# Altium schematic symbol library TI Power Management Shunt Voltage Reference.SchLib: 1526 symbols (part 1 of 18) (continued)
## LM385BDRG4-2-5
designator U?
Micropower Voltage Reference, 2.5 V, 20 ppm / degC, 20 mA, 0 to 70 degC, 8-pin SOIC (D), Green (RoHS & no Sb/Br); Manufacturer: Texas Instruments; PartNumber: LM385BDRG4-2-5; Initial Accuracy @ 25/deg C(%): 1.5; Iout/Iz(Max)(mA): 20; Rating: Catalog; SubFamily: Shunt Voltage Reference; VO(V): 2.5; DatasheetVersion: SLVS023J; PackageVersion: 4040047-3/M; PackageReference: D8; PackageDescription: 8-Pin Plastic Small Outline, Body 4.9 x 3.9 mm, Pitch 1.27 mm; Supplier 1: Digi-Key; Supplier Part Number 1: LM385BDRG4-2-5-ND; Supplier 2: Newark; Supplier Part Number 2: 41M3423; Supplier 3: Mouser; Supplier Part Number 3: 595-LM385BDRG4-2-5; Eco-Plan: Green (RoHS & no Sb/Br); Min Iz for Regulation(uA): 20; Temp Coeff(Typ)(ppm/ degree C): 20; Mounting Technology: Surface Mount; Code_JEDEC: MS-012; ComponentLink1Description: Manufacturer URL; ComponentLink1URL: http://www.ti.com/; ComponentLink2Description: Datasheet; ComponentLink2URL: http://www.ti.com/general/docs/lit/getliterature.tsp?genericPartNumber=LM385B-2.5&fileType=pdf; ComponentLink3Description: Package Specification; ComponentLink3URL: http://www.ti.com/litv/pdf/msoi002j
footprint TI-D8_N (SOIC, 8-Leads, Body 4.9x3.9mm, Pitch 1.27mm, IPC Medium Density)
part A pins: 4 ANODE, 8 CATHODE
part B pins: 1 NC "No internal connection", 2 NC "No internal connection", 3 NC "No internal connection", 5 NC "No internal connection", 6 NC "No internal connection", 7 NC "No internal connection"

## LM385BLP-1-2
designator U?
Micropower Voltage Reference, 20 ppm / degC, 20 mA, 0 to 70 degC, 3-pin TO-92 (LP), Pb-Free (RoHS); Manufacturer: Texas Instruments; PartNumber: LM385BLP-1-2; Initial Accuracy @ 25/deg C(%): 1; Iout/Iz(Max)(mA): 20; Min Iz for Regulation(uA): 10; Rating: Catalog; SubFamily: Shunt Voltage Reference; VO(V): 1.235; DatasheetVersion: SLVS075I; PackageVersion: 4040001-2/C; PackageReference: LP3; PackageDescription: Plastic Cylindrical Package, Formed Lead Option (TO-92); Supplier 1: Digi-Key; Supplier Part Number 1: 296-9558-5-ND; Supplier 2: Farnell; Supplier Part Number 2: 1690615; Supplier 3: Newark; Supplier Part Number 3: 14P6051; Supplier 4: Mouser; Supplier Part Number 4: 595-LM385BLP-1-2; Eco-Plan: Pb-Free (RoHS); Temp Coeff(Typ)(ppm/ degree C): 20; Mounting Technology: Through Hole; Code_JEDEC: TO-226; ComponentLink1Description: Manufacturer URL; ComponentLink1URL: http://www.ti.com/; ComponentLink2Description: Datasheet; ComponentLink2URL: http://www.ti.com/general/docs/lit/getliterature.tsp?genericPartNumber=LM385B-1.2&fileType=pdf; ComponentLink3Description: Package Specification; ComponentLink3URL: http://www.ti.com/litv/pdf/msot002a
footprint TI-LP3 (TO, Flat Index; 3 In-Line, Formed Axial Leads; Body Dia. 4.8mm; Leads 0.56 x 0.41 mm (max))
pins: 1 NC, 2 CATHODE, 3 ANODE

## LM385BLP-2-5
designator U?
Micropower Voltage Reference, 2.5 V, 20 ppm / degC, 20 mA, 0 to 70 degC, 3-pin TO-92 (LP), Pb-Free (RoHS); Manufacturer: Texas Instruments; PartNumber: LM385BLP-2-5; Initial Accuracy @ 25/deg C(%): 1.5; Iout/Iz(Max)(mA): 20; Rating: Catalog; SubFamily: Shunt Voltage Reference; VO(V): 2.5; DatasheetVersion: SLVS023J; PackageVersion: 4040001-2/C; PackageReference: LP3; PackageDescription: Plastic Cylindrical Package, Formed Lead Option (TO-92); Supplier 1: Digi-Key; Supplier Part Number 1: 296-9559-5-ND; Supplier 2: Newark; Supplier Part Number 2: 06F9436; Supplier 3: Mouser; Supplier Part Number 3: 595-LM385BLP-2-5; Eco-Plan: Pb-Free (RoHS); Min Iz for Regulation(uA): 20; Temp Coeff(Typ)(ppm/ degree C): 20; Mounting Technology: Through Hole; Code_JEDEC: TO-226; ComponentLink1Description: Manufacturer URL; ComponentLink1URL: http://www.ti.com/; ComponentLink2Description: Datasheet; ComponentLink2URL: http://www.ti.com/general/docs/lit/getliterature.tsp?genericPartNumber=LM385B-2.5&fileType=pdf; ComponentLink3Description: Package Specification; ComponentLink3URL: http://www.ti.com/litv/pdf/msot002a
footprint TI-LP3 (TO, Flat Index; 3 In-Line, Formed Axial Leads; Body Dia. 4.8mm; Leads 0.56 x 0.41 mm (max))
pins: 1 NC, 2 CATHODE, 3 ANODE

## LM385BLPE3-1-2
designator U?
Micropower Voltage Reference, 20 ppm / degC, 20 mA, 0 to 70 degC, 3-pin TO-92 (LP), Pb-Free (RoHS); Manufacturer: Texas Instruments; PartNumber: LM385BLPE3-1-2; Initial Accuracy @ 25/deg C(%): 2; Iout/Iz(Max)(mA): 20; Min Iz for Regulation(uA): 10; Rating: Catalog; SubFamily: Shunt Voltage Reference; VO(V): 1.235; DatasheetVersion: SLVS075I; PackageVersion: 4040001-2/C; PackageReference: LP3; PackageDescription: Plastic Cylindrical Package, Formed Lead Option (TO-92); Supplier 1: Digi-Key; Supplier Part Number 1: LM385BLPE3-1-2-ND; Supplier 2: Mouser; Supplier Part Number 2: 595-LM385BLPE3-1-2; Eco-Plan: Pb-Free (RoHS); Temp Coeff(Typ)(ppm/ degree C): 20; Mounting Technology: Through Hole; Code_JEDEC: TO-226; ComponentLink1Description: Manufacturer URL; ComponentLink1URL: http://www.ti.com/; ComponentLink2Description: Datasheet; ComponentLink2URL: http://www.ti.com/general/docs/lit/getliterature.tsp?genericPartNumber=LM385-1.2&fileType=pdf; ComponentLink3Description: Package Specification; ComponentLink3URL: http://www.ti.com/litv/pdf/msot002a
footprint TI-LP3 (TO, Flat Index; 3 In-Line, Formed Axial Leads; Body Dia. 4.8mm; Leads 0.56 x 0.41 mm (max))
pins: 1 NC, 2 CATHODE, 3 ANODE

## LM385BLPE3-2-5
designator U?
Micropower Voltage Reference, 2.5 V, 20 ppm / degC, 20 mA, 0 to 70 degC, 3-pin TO-92 (LP), Pb-Free (RoHS); Manufacturer: Texas Instruments; PartNumber: LM385BLPE3-2-5; Initial Accuracy @ 25/deg C(%): 3; Iout/Iz(Max)(mA): 20; Rating: Catalog; SubFamily: Shunt Voltage Reference; VO(V): 2.5; DatasheetVersion: SLVS023J; PackageVersion: 4040001-2/C; PackageReference: LP3; PackageDescription: Plastic Cylindrical Package, Formed Lead Option (TO-92); Supplier 1: Digi-Key; Supplier Part Number 1: LM385BLPE3-2-5-ND; Supplier 2: Newark; Supplier Part Number 2: 67K8075; Supplier 3: Mouser; Supplier Part Number 3: 595-LM385BLPE3-2-5; Eco-Plan: Pb-Free (RoHS); Min Iz for Regulation(uA): 20; Temp Coeff(Typ)(ppm/ degree C): 20; Mounting Technology: Through Hole; Code_JEDEC: TO-226; ComponentLink1Description: Manufacturer URL; ComponentLink1URL: http://www.ti.com/; ComponentLink2Description: Datasheet; ComponentLink2URL: http://www.ti.com/general/docs/lit/getliterature.tsp?genericPartNumber=LM385-2.5&fileType=pdf; ComponentLink3Description: Package Specification; ComponentLink3URL: http://www.ti.com/litv/pdf/msot002a
footprint TI-LP3 (TO, Flat Index; 3 In-Line, Formed Axial Leads; Body Dia. 4.8mm; Leads 0.56 x 0.41 mm (max))
pins: 1 NC, 2 CATHODE, 3 ANODE

## LM385BLPR-1-2
designator U?
Micropower Voltage Reference, 20 ppm / degC, 20 mA, 0 to 70 degC, 3-pin TO-92 (LP), Pb-Free (RoHS); Manufacturer: Texas Instruments; PartNumber: LM385BLPR-1-2; Initial Accuracy @ 25/deg C(%): 1; Iout/Iz(Max)(mA): 20; Min Iz for Regulation(uA): 10; Rating: Catalog; SubFamily: Shunt Voltage Reference; VO(V): 1.235; DatasheetVersion: SLVS075I; PackageVersion: 4040001-2/C; PackageReference: LP3; PackageDescription: Plastic Cylindrical Package, Formed Lead Option (TO-92); Supplier 1: Digi-Key; Supplier Part Number 1: 296-31450-2-ND; Supplier 2: Digi-Key; Supplier Part Number 2: 296-31450-1-ND; Supplier 3: Newark; Supplier Part Number 3: 75C0850; Supplier 4: Mouser; Supplier Part Number 4: 595-LM385BLPR-1-2; Eco-Plan: Pb-Free (RoHS); Temp Coeff(Typ)(ppm/ degree C): 20; Mounting Technology: Through Hole; Code_JEDEC: TO-226; ComponentLink1Description: Manufacturer URL; ComponentLink1URL: http://www.ti.com/; ComponentLink2Description: Datasheet; ComponentLink2URL: http://www.ti.com/general/docs/lit/getliterature.tsp?genericPartNumber=LM385B-1.2&fileType=pdf; ComponentLink3Description: Package Specification; ComponentLink3URL: http://www.ti.com/litv/pdf/msot002a
footprint TI-LP3 (TO, Flat Index; 3 In-Line, Formed Axial Leads; Body Dia. 4.8mm; Leads 0.56 x 0.41 mm (max))
pins: 1 NC, 2 CATHODE, 3 ANODE

## LM385BLPR-2-5
designator U?
Micropower Voltage Reference, 2.5 V, 20 ppm / degC, 20 mA, 0 to 70 degC, 3-pin TO-92 (LP), Pb-Free (RoHS); Manufacturer: Texas Instruments; PartNumber: LM385BLPR-2-5; Initial Accuracy @ 25/deg C(%): 1.5; Iout/Iz(Max)(mA): 20; Rating: Catalog; SubFamily: Shunt Voltage Reference; VO(V): 2.5; DatasheetVersion: SLVS023J; PackageVersion: 4040001-2/C; PackageReference: LP3; PackageDescription: Plastic Cylindrical Package, Formed Lead Option (TO-92); Supplier 1: Digi-Key; Supplier Part Number 1: LM385BLPR-2-5-ND; Supplier 2: Mouser; Supplier Part Number 2: 595-LM385BLPR-2-5; Eco-Plan: Pb-Free (RoHS); Min Iz for Regulation(uA): 20; Temp Coeff(Typ)(ppm/ degree C): 20; Mounting Technology: Through Hole; Code_JEDEC: TO-226; ComponentLink1Description: Manufacturer URL; ComponentLink1URL: http://www.ti.com/; ComponentLink2Description: Datasheet; ComponentLink2URL: http://www.ti.com/general/docs/lit/getliterature.tsp?genericPartNumber=LM385B-2.5&fileType=pdf; ComponentLink3Description: Package Specification; ComponentLink3URL: http://www.ti.com/litv/pdf/msot002a
footprint TI-LP3 (TO, Flat Index; 3 In-Line, Formed Axial Leads; Body Dia. 4.8mm; Leads 0.56 x 0.41 mm (max))
pins: 1 NC, 2 CATHODE, 3 ANODE

## LM385BLPRE3-1-2
designator U?
Micropower Voltage Reference, 20 ppm / degC, 20 mA, 0 to 70 degC, 3-pin TO-92 (LP), Pb-Free (RoHS); Manufacturer: Texas Instruments; PartNumber: LM385BLPRE3-1-2; Initial Accuracy @ 25/deg C(%): 2; Iout/Iz(Max)(mA): 20; Min Iz for Regulation(uA): 10; Rating: Catalog; SubFamily: Shunt Voltage Reference; VO(V): 1.235; DatasheetVersion: SLVS075I; PackageVersion: 4040001-2/C; PackageReference: LP3; PackageDescription: Plastic Cylindrical Package, Formed Lead Option (TO-92); Supplier 1: Digi-Key; Supplier Part Number 1: LM385BLPRE3-1-2-ND; Supplier 2: Mouser; Supplier Part Number 2: 595-LM385BLPRE3-1-2; Eco-Plan: Pb-Free (RoHS); Temp Coeff(Typ)(ppm/ degree C): 20; Mounting Technology: Through Hole; Code_JEDEC: TO-226; ComponentLink1Description: Manufacturer URL; ComponentLink1URL: http://www.ti.com/; ComponentLink2Description: Datasheet; ComponentLink2URL: http://www.ti.com/general/docs/lit/getliterature.tsp?genericPartNumber=LM385-1.2&fileType=pdf; ComponentLink3Description: Package Specification; ComponentLink3URL: http://www.ti.com/litv/pdf/msot002a
footprint TI-LP3 (TO, Flat Index; 3 In-Line, Formed Axial Leads; Body Dia. 4.8mm; Leads 0.56 x 0.41 mm (max))
pins: 1 NC, 2 CATHODE, 3 ANODE

## LM385BLPRE3-2-5
designator U?
Micropower Voltage Reference, 2.5 V, 20 ppm / degC, 20 mA, 0 to 70 degC, 3-pin TO-92 (LP), Pb-Free (RoHS); Manufacturer: Texas Instruments; PartNumber: LM385BLPRE3-2-5; Initial Accuracy @ 25/deg C(%): 3; Iout/Iz(Max)(mA): 20; Rating: Catalog; SubFamily: Shunt Voltage Reference; VO(V): 2.5; DatasheetVersion: SLVS023J; PackageVersion: 4040001-2/C; PackageReference: LP3; PackageDescription: Plastic Cylindrical Package, Formed Lead Option (TO-92); Supplier 1: Digi-Key; Supplier Part Number 1: LM385BLPRE3-2-5-ND; Supplier 2: Mouser; Supplier Part Number 2: 595-LM385BLPRE3-2-5; Eco-Plan: Pb-Free (RoHS); Min Iz for Regulation(uA): 20; Temp Coeff(Typ)(ppm/ degree C): 20; Mounting Technology: Through Hole; Code_JEDEC: TO-226; ComponentLink1Description: Manufacturer URL; ComponentLink1URL: http://www.ti.com/; ComponentLink2Description: Datasheet; ComponentLink2URL: http://www.ti.com/general/docs/lit/getliterature.tsp?genericPartNumber=LM385-2.5&fileType=pdf; ComponentLink3Description: Package Specification; ComponentLink3URL: http://www.ti.com/litv/pdf/msot002a
footprint TI-LP3 (TO, Flat Index; 3 In-Line, Formed Axial Leads; Body Dia. 4.8mm; Leads 0.56 x 0.41 mm (max))
pins: 1 NC, 2 CATHODE, 3 ANODE

## LM385BPW-1-2
designator U?
Micropower Voltage Reference, 20 ppm / degC, 20 mA, 0 to 70 degC, 8-pin TSSOP (PW), Green (RoHS & no Sb/Br); Manufacturer: Texas Instruments; PartNumber: LM385BPW-1-2; Initial Accuracy @ 25/deg C(%): 1; Iout/Iz(Max)(mA): 20; Min Iz for Regulation(uA): 10; Rating: Catalog; SubFamily: Shunt Voltage Reference; VO(V): 1.235; DatasheetVersion: SLVS075I; PackageVersion: 4040064-2/G; PackageReference: PW8; PackageDescription: 8-Pin Plastic Small Outline, Body 4.4 x 3 mm, Pitch 0.65 mm; Supplier 1: Digi-Key; Supplier Part Number 1: LM385BPW-1-2-ND; Supplier 2: Newark; Supplier Part Number 2: 02H5267; Supplier 3: Mouser; Supplier Part Number 3: 595-LM385BPW-1-2; Eco-Plan: Green (RoHS & no Sb/Br); Temp Coeff(Typ)(ppm/ degree C): 20; Mounting Technology: Surface Mount; Code_JEDEC: MO-153; ComponentLink1Description: Manufacturer URL; ComponentLink1URL: http://www.ti.com/; ComponentLink2Description: Datasheet; ComponentLink2URL: http://www.ti.com/general/docs/lit/getliterature.tsp?genericPartNumber=LM385B-1.2&fileType=pdf; ComponentLink3Description: Package Specification; ComponentLink3URL: http://www.ti.com/litv/pdf/mtss001d
footprint TI-PW8_N (SOP, 8-Leads, Body 4.4x3mm, Pitch 0.65mm, IPC Medium Density)
part A pins: 4 ANODE, 8 CATHODE
part B pins: 1 NC, 2 NC "No internal connection", 3 NC "No internal connection", 5 NC "No internal connection", 6 NC "No internal connection", 7 NC "No internal connection"

## LM385BPWE4-1-2
designator U?
Micropower Voltage Reference, 20 ppm / degC, 20 mA, 0 to 70 degC, 8-pin TSSOP (PW), Green (RoHS & no Sb/Br); Manufacturer: Texas Instruments; PartNumber: LM385BPWE4-1-2; Initial Accuracy @ 25/deg C(%): 1; Iout/Iz(Max)(mA): 20; Min Iz for Regulation(uA): 10; Rating: Catalog; SubFamily: Shunt Voltage Reference; VO(V): 1.235; DatasheetVersion: SLVS075I; PackageVersion: 4040064-2/G; PackageReference: PW8; PackageDescription: 8-Pin Plastic Small Outline, Body 4.4 x 3 mm, Pitch 0.65 mm; Supplier 1: Digi-Key; Supplier Part Number 1: LM385BPWE4-1-2-ND; Supplier 2: Mouser; Supplier Part Number 2: 595-LM385BPWE4-1-2; Eco-Plan: Green (RoHS & no Sb/Br); Temp Coeff(Typ)(ppm/ degree C): 20; Mounting Technology: Surface Mount; Code_JEDEC: MO-153; ComponentLink1Description: Manufacturer URL; ComponentLink1URL: http://www.ti.com/; ComponentLink2Description: Datasheet; ComponentLink2URL: http://www.ti.com/general/docs/lit/getliterature.tsp?genericPartNumber=LM385B-1.2&fileType=pdf; ComponentLink3Description: Package Specification; ComponentLink3URL: http://www.ti.com/litv/pdf/mtss001d
footprint TI-PW8_N (SOP, 8-Leads, Body 4.4x3mm, Pitch 0.65mm, IPC Medium Density)
part A pins: 4 ANODE, 8 CATHODE
part B pins: 1 NC, 2 NC "No internal connection", 3 NC "No internal connection", 5 NC "No internal connection", 6 NC "No internal connection", 7 NC "No internal connection"

## LM385BPWG4-1-2
designator U?
Micropower Voltage Reference, 20 ppm / degC, 20 mA, 0 to 70 degC, 8-pin TSSOP (PW), Green (RoHS & no Sb/Br); Manufacturer: Texas Instruments; PartNumber: LM385BPWG4-1-2; Initial Accuracy @ 25/deg C(%): 1; Iout/Iz(Max)(mA): 20; Min Iz for Regulation(uA): 10; Rating: Catalog; SubFamily: Shunt Voltage Reference; VO(V): 1.235; DatasheetVersion: SLVS075I; PackageVersion: 4040064-2/G; PackageReference: PW8; PackageDescription: 8-Pin Plastic Small Outline, Body 4.4 x 3 mm, Pitch 0.65 mm; Supplier 1: Digi-Key; Supplier Part Number 1: LM385BPWG4-1-2-ND; Supplier 2: Newark; Supplier Part Number 2: 46M6578; Supplier 3: Mouser; Supplier Part Number 3: 595-LM385BPWG4-1-2; Eco-Plan: Green (RoHS & no Sb/Br); Temp Coeff(Typ)(ppm/ degree C): 20; Mounting Technology: Surface Mount; Code_JEDEC: MO-153; ComponentLink1Description: Manufacturer URL; ComponentLink1URL: http://www.ti.com/; ComponentLink2Description: Datasheet; ComponentLink2URL: http://www.ti.com/general/docs/lit/getliterature.tsp?genericPartNumber=LM385B-1.2&fileType=pdf; ComponentLink3Description: Package Specification; ComponentLink3URL: http://www.ti.com/litv/pdf/mtss001d
footprint TI-PW8_N (SOP, 8-Leads, Body 4.4x3mm, Pitch 0.65mm, IPC Medium Density)
part A pins: 4 ANODE, 8 CATHODE
part B pins: 1 NC, 2 NC "No internal connection", 3 NC "No internal connection", 5 NC "No internal connection", 6 NC "No internal connection", 7 NC "No internal connection"

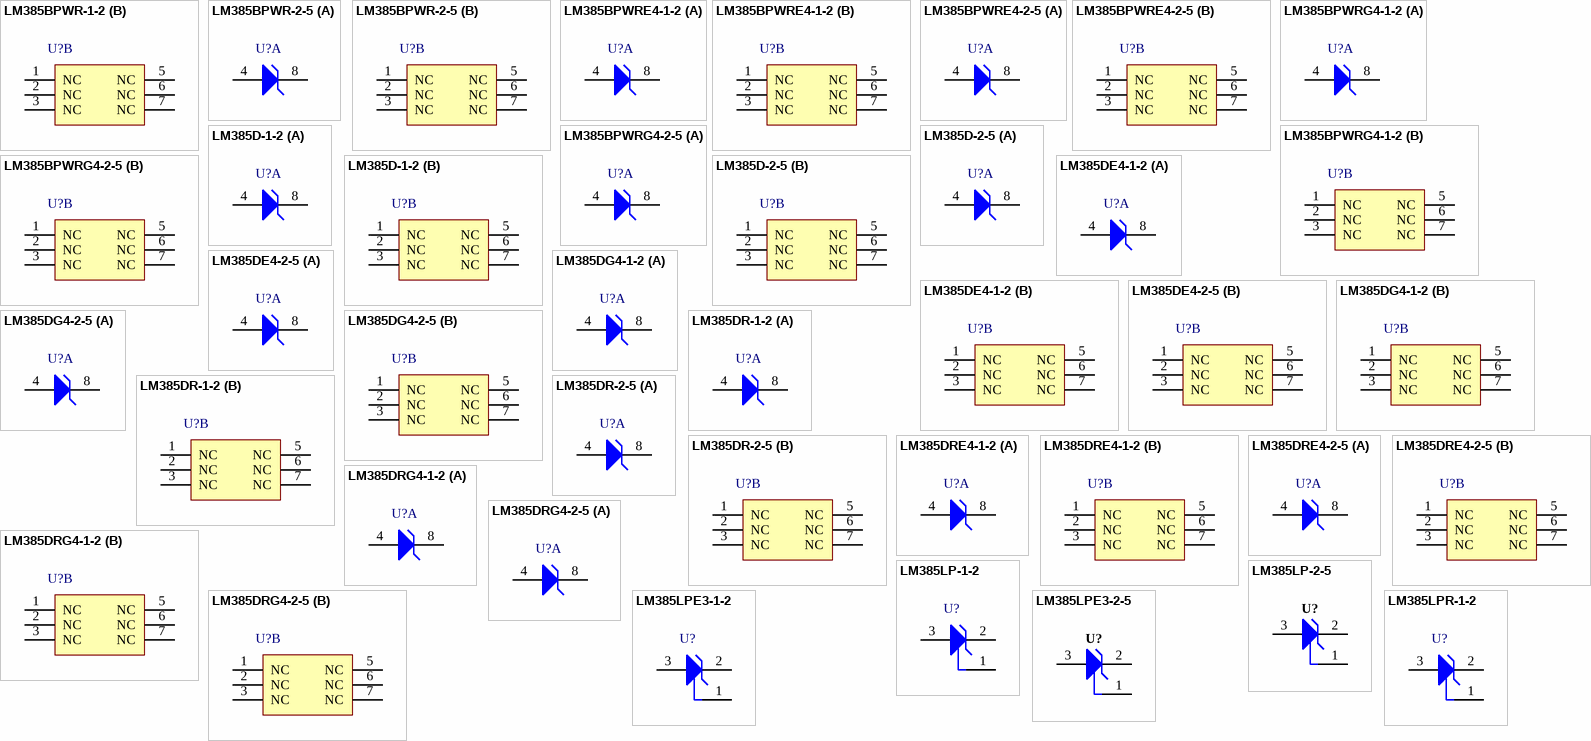
[diagram p3: symbols LM385BPWR-1-2 to LM385LPR-1-2]

## LM385BPWR-1-2
designator U?
Micropower Voltage Reference, 20 ppm / degC, 20 mA, 0 to 70 degC, 8-pin TSSOP (PW), Green (RoHS & no Sb/Br); Manufacturer: Texas Instruments; PartNumber: LM385BPWR-1-2; Initial Accuracy @ 25/deg C(%): 1; Iout/Iz(Max)(mA): 20; Min Iz for Regulation(uA): 10; Rating: Catalog; SubFamily: Shunt Voltage Reference; VO(V): 1.235; DatasheetVersion: SLVS075I; PackageVersion: 4040064-2/G; PackageReference: PW8; PackageDescription: 8-Pin Plastic Small Outline, Body 4.4 x 3 mm, Pitch 0.65 mm; Supplier 1: Digi-Key; Supplier Part Number 1: 296-13073-2-ND; Supplier 2: Digi-Key; Supplier Part Number 2: 296-13073-1-ND; Supplier 3: Digi-Key; Supplier Part Number 3: 296-13073-6-ND; Supplier 4: Farnell; Supplier Part Number 4: 1575474; Supplier 5: Newark; Supplier Part Number 5: 75C0852; Supplier 6: Mouser; Supplier Part Number 6: 595-LM385BPWR-1-2; Eco-Plan: Green (RoHS & no Sb/Br); Temp Coeff(Typ)(ppm/ degree C): 20; Mounting Technology: Surface Mount; Code_JEDEC: MO-153; ComponentLink1Description: Manufacturer URL; ComponentLink1URL: http://www.ti.com/; ComponentLink2Description: Datasheet; ComponentLink2URL: http://www.ti.com/general/docs/lit/getliterature.tsp?genericPartNumber=LM385B-1.2&fileType=pdf; ComponentLink3Description: Package Specification; ComponentLink3URL: http://www.ti.com/litv/pdf/mtss001d
footprint TI-PW8_N (SOP, 8-Leads, Body 4.4x3mm, Pitch 0.65mm, IPC Medium Density)
part A pins: 4 ANODE, 8 CATHODE
part B pins: 1 NC, 2 NC "No internal connection", 3 NC "No internal connection", 5 NC "No internal connection", 6 NC "No internal connection", 7 NC "No internal connection"

## LM385BPWR-2-5
designator U?
Micropower Voltage Reference, 2.5 V, 20 ppm / degC, 20 mA, 0 to 70 degC, 8-pin TSSOP (PW), Green (RoHS & no Sb/Br); Manufacturer: Texas Instruments; PartNumber: LM385BPWR-2-5; Initial Accuracy @ 25/deg C(%): 1.5; Iout/Iz(Max)(mA): 20; Rating: Catalog; SubFamily: Shunt Voltage Reference; VO(V): 2.5; DatasheetVersion: SLVS023J; PackageVersion: 4040064-2/G; PackageReference: PW8; PackageDescription: 8-Pin Plastic Small Outline, Body 4.4 x 3 mm, Pitch 0.65 mm; Supplier 1: Digi-Key; Supplier Part Number 1: 296-13074-2-ND; Supplier 2: Digi-Key; Supplier Part Number 2: 296-13074-1-ND; Supplier 3: Digi-Key; Supplier Part Number 3: 296-13074-6-ND; Supplier 4: Newark; Supplier Part Number 4: 75C0853; Supplier 5: Mouser; Supplier Part Number 5: 595-LM385BPWR-2-5; Eco-Plan: Green (RoHS & no Sb/Br); Min Iz for Regulation(uA): 20; Temp Coeff(Typ)(ppm/ degree C): 20; Mounting Technology: Surface Mount; Code_JEDEC: MO-153; ComponentLink1Description: Manufacturer URL; ComponentLink1URL: http://www.ti.com/; ComponentLink2Description: Datasheet; ComponentLink2URL: http://www.ti.com/general/docs/lit/getliterature.tsp?genericPartNumber=LM385B-2.5&fileType=pdf; ComponentLink3Description: Package Specification; ComponentLink3URL: http://www.ti.com/litv/pdf/mtss001d
footprint TI-PW8_N (SOP, 8-Leads, Body 4.4x3mm, Pitch 0.65mm, IPC Medium Density)
part A pins: 4 ANODE, 8 CATHODE
part B pins: 1 NC, 2 NC, 3 NC, 5 NC, 6 NC, 7 NC

## LM385BPWRE4-1-2
designator U?
Micropower Voltage Reference, 20 ppm / degC, 20 mA, 0 to 70 degC, 8-pin TSSOP (PW), Green (RoHS & no Sb/Br); Manufacturer: Texas Instruments; PartNumber: LM385BPWRE4-1-2; Initial Accuracy @ 25/deg C(%): 1; Iout/Iz(Max)(mA): 20; Min Iz for Regulation(uA): 10; Rating: Catalog; SubFamily: Shunt Voltage Reference; VO Adj(Max)(V): 1.247; VO Adj(Min)(V): 1.223; VO(V): 1.235; DatasheetVersion: SLVS075I; PackageVersion: 4040064-2/G; PackageReference: PW8; PackageDescription: 8-Pin Plastic Small Outline, Body 4.4 x 3 mm, Pitch 0.65 mm; Supplier 1: Digi-Key; Supplier Part Number 1: LM385BPWRE4-1-2-ND; Supplier 2: Mouser; Supplier Part Number 2: 595-LM385BPWRE4-1-2; Eco-Plan: Green (RoHS & no Sb/Br); Temp Coeff(Typ)(ppm/ degree C): 20; Mounting Technology: Surface Mount; Code_JEDEC: MO-153; ComponentLink1Description: Manufacturer URL; ComponentLink1URL: http://www.ti.com/; ComponentLink2Description: Datasheet; ComponentLink2URL: http://www.ti.com/general/docs/lit/getliterature.tsp?genericPartNumber=LM385B-1.2&fileType=pdf; ComponentLink3Description: Package Specification; ComponentLink3URL: http://www.ti.com/litv/pdf/mtss001d
footprint TI-PW8_N (SOP, 8-Leads, Body 4.4x3mm, Pitch 0.65mm, IPC Medium Density)
part A pins: 4 ANODE, 8 CATHODE
part B pins: 1 NC, 2 NC "No internal connection", 3 NC "No internal connection", 5 NC "No internal connection", 6 NC "No internal connection", 7 NC "No internal connection"

## LM385BPWRE4-2-5
designator U?
Micropower Voltage Reference, 2.5 V, 20 ppm / degC, 20 mA, 0 to 70 degC, 8-pin TSSOP (PW), Green (RoHS & no Sb/Br); Manufacturer: Texas Instruments; PartNumber: LM385BPWRE4-2-5; Initial Accuracy @ 25/deg C(%): 1.5; Iout/Iz(Max)(mA): 20; Rating: Catalog; SubFamily: Shunt Voltage Reference; VO(V): 2.5; DatasheetVersion: SLVS023J; PackageVersion: 4040064-2/G; PackageReference: PW8; PackageDescription: 8-Pin Plastic Small Outline, Body 4.4 x 3 mm, Pitch 0.65 mm; Supplier 1: Digi-Key; Supplier Part Number 1: LM385BPWRE4-2-5-ND; Supplier 2: Mouser; Supplier Part Number 2: 595-LM385BPWRE4-2-5; Eco-Plan: Green (RoHS & no Sb/Br); Min Iz for Regulation(uA): 20; Temp Coeff(Typ)(ppm/ degree C): 20; Mounting Technology: Surface Mount; Code_JEDEC: MO-153; ComponentLink1Description: Manufacturer URL; ComponentLink1URL: http://www.ti.com/; ComponentLink2Description: Datasheet; ComponentLink2URL: http://www.ti.com/general/docs/lit/getliterature.tsp?genericPartNumber=LM385B-2.5&fileType=pdf; ComponentLink3Description: Package Specification; ComponentLink3URL: http://www.ti.com/litv/pdf/mtss001d
footprint TI-PW8_N (SOP, 8-Leads, Body 4.4x3mm, Pitch 0.65mm, IPC Medium Density)
part A pins: 4 ANODE, 8 CATHODE
part B pins: 1 NC, 2 NC, 3 NC, 5 NC, 6 NC, 7 NC

## LM385BPWRG4-1-2
designator U?
Micropower Voltage Reference, 20 ppm / degC, 20 mA, 0 to 70 degC, 8-pin TSSOP (PW), Green (RoHS & no Sb/Br); Manufacturer: Texas Instruments; PartNumber: LM385BPWRG4-1-2; Initial Accuracy @ 25/deg C(%): 1; Iout/Iz(Max)(mA): 20; Min Iz for Regulation(uA): 10; Rating: Catalog; SubFamily: Shunt Voltage Reference; VO(V): 1.235; DatasheetVersion: SLVS075I; PackageVersion: 4040064-2/G; PackageReference: PW8; PackageDescription: 8-Pin Plastic Small Outline, Body 4.4 x 3 mm, Pitch 0.65 mm; Supplier 1: Digi-Key; Supplier Part Number 1: LM385BPWRG4-1-2-ND; Supplier 2: Newark; Supplier Part Number 2: 46M6580; Supplier 3: Mouser; Supplier Part Number 3: 595-LM385BPWRG4-1-2; Eco-Plan: Green (RoHS & no Sb/Br); Temp Coeff(Typ)(ppm/ degree C): 20; Mounting Technology: Surface Mount; Code_JEDEC: MO-153; ComponentLink1Description: Manufacturer URL; ComponentLink1URL: http://www.ti.com/; ComponentLink2Description: Datasheet; ComponentLink2URL: http://www.ti.com/general/docs/lit/getliterature.tsp?genericPartNumber=LM385B-1.2&fileType=pdf; ComponentLink3Description: Package Specification; ComponentLink3URL: http://www.ti.com/litv/pdf/mtss001d
footprint TI-PW8_N (SOP, 8-Leads, Body 4.4x3mm, Pitch 0.65mm, IPC Medium Density)
part A pins: 4 ANODE, 8 CATHODE
part B pins: 1 NC, 2 NC "No internal connection", 3 NC "No internal connection", 5 NC "No internal connection", 6 NC "No internal connection", 7 NC "No internal connection"

## LM385BPWRG4-2-5
designator U?
Micropower Voltage Reference, 2.5 V, 20 ppm / degC, 20 mA, 0 to 70 degC, 8-pin TSSOP (PW), Green (RoHS & no Sb/Br); Manufacturer: Texas Instruments; PartNumber: LM385BPWRG4-2-5; Initial Accuracy @ 25/deg C(%): 1.5; Iout/Iz(Max)(mA): 20; Rating: Catalog; SubFamily: Shunt Voltage Reference; VO(V): 2.5; DatasheetVersion: SLVS023J; PackageVersion: 4040064-2/G; PackageReference: PW8; PackageDescription: 8-Pin Plastic Small Outline, Body 4.4 x 3 mm, Pitch 0.65 mm; Supplier 1: Digi-Key; Supplier Part Number 1: LM385BPWRG4-2-5-ND; Supplier 2: Newark; Supplier Part Number 2: 46M6581; Supplier 3: Mouser; Supplier Part Number 3: 595-LM385BPWRG4-2-5; Eco-Plan: Green (RoHS & no Sb/Br); Min Iz for Regulation(uA): 20; Temp Coeff(Typ)(ppm/ degree C): 20; Mounting Technology: Surface Mount; Code_JEDEC: MO-153; ComponentLink1Description: Manufacturer URL; ComponentLink1URL: http://www.ti.com/; ComponentLink2Description: Datasheet; ComponentLink2URL: http://www.ti.com/general/docs/lit/getliterature.tsp?genericPartNumber=LM385B-2.5&fileType=pdf; ComponentLink3Description: Package Specification; ComponentLink3URL: http://www.ti.com/litv/pdf/mtss001d
footprint TI-PW8_N (SOP, 8-Leads, Body 4.4x3mm, Pitch 0.65mm, IPC Medium Density)
part A pins: 4 ANODE, 8 CATHODE
part B pins: 1 NC, 2 NC, 3 NC, 5 NC, 6 NC, 7 NC

## LM385D-1-2
designator U?
Micropower Voltage Reference, 1.235 V, 20 ppm / degC, 20 mA, 0 to 70 degC, 8-pin SOIC (D), Green (RoHS & no Sb/Br); Manufacturer: Texas Instruments; PartNumber: LM385D-1-2; Initial Accuracy @ 25/deg C(%): 2; Iout/Iz(Max)(mA): 20; Min Iz for Regulation(uA): 10; Rating: Catalog; SubFamily: Shunt Voltage Reference; VO(V): 1.235; DatasheetVersion: SLVS075I; PackageVersion: 4040047-3/M; PackageReference: D8; PackageDescription: 8-Pin Plastic Small Outline, Body 4.9 x 3.9 mm, Pitch 1.27 mm; Supplier 1: Digi-Key; Supplier Part Number 1: 296-9560-5-ND; Supplier 2: Farnell; Supplier Part Number 2: 1459239; Supplier 3: Newark; Supplier Part Number 3: 61M7451; Supplier 4: Newark; Supplier Part Number 4: 06F9441; Supplier 5: Mouser; Supplier Part Number 5: 595-LM385D-1-2; Eco-Plan: Green (RoHS & no Sb/Br); Temp Coeff(Typ)(ppm/ degree C): 20; Mounting Technology: Surface Mount; Code_JEDEC: MS-012; ComponentLink1Description: Manufacturer URL; ComponentLink1URL: http://www.ti.com/; ComponentLink2Description: Datasheet; ComponentLink2URL: http://www.ti.com/general/docs/lit/getliterature.tsp?genericPartNumber=LM385-1.2&fileType=pdf; ComponentLink3Description: Package Specification; ComponentLink3URL: http://www.ti.com/litv/pdf/msoi002j; ComponentLink4Description: URL Link1; ComponentLink4URL: Samples URL:http://www.ti.com/lit/ds/symlink/lm385-1.2.pdf
footprint TI-D8_N (SOIC, 8-Leads, Body 4.9x3.9mm, Pitch 1.27mm, IPC Medium Density)
part A pins: 4 ANODE, 8 CATHODE
part B pins: 1 NC "No internal connection", 2 NC "No internal connection", 3 NC "No internal connection", 5 NC "No internal connection", 6 NC "No internal connection", 7 NC "No internal connection"

## LM385D-2-5
designator U?
Micropower Voltage Reference, 2.5 V, 20 ppm / degC, 20 mA, 0 to 70 degC, 8-pin SOIC (D), Green (RoHS & no Sb/Br); Manufacturer: Texas Instruments; PartNumber: LM385D-2-5; Initial Accuracy @ 25/deg C(%): 3; Iout/Iz(Max)(mA): 20; Rating: Catalog; SubFamily: Shunt Voltage Reference; VO(V): 2.5; DatasheetVersion: SLVS023J; PackageVersion: 4040047-3/M; PackageReference: D8; PackageDescription: 8-Pin Plastic Small Outline, Body 4.9 x 3.9 mm, Pitch 1.27 mm; Supplier 1: Digi-Key; Supplier Part Number 1: 296-9561-5-ND; Supplier 2: Farnell; Supplier Part Number 2: 8389268; Supplier 3: Newark; Supplier Part Number 3: 38K3725; Supplier 4: Newark; Supplier Part Number 4: 06F9443; Supplier 5: Mouser; Supplier Part Number 5: 595-LM385D-2-5; Eco-Plan: Green (RoHS & no Sb/Br); Min Iz for Regulation(uA): 20; Temp Coeff(Typ)(ppm/ degree C): 20; Mounting Technology: Surface Mount; Code_JEDEC: MS-012; ComponentLink1Description: Manufacturer URL; ComponentLink1URL: http://www.ti.com/; ComponentLink2Description: Datasheet; ComponentLink2URL: http://www.ti.com/general/docs/lit/getliterature.tsp?genericPartNumber=LM385-2.5&fileType=pdf; ComponentLink3Description: Package Specification; ComponentLink3URL: http://www.ti.com/litv/pdf/msoi002j
footprint TI-D8_N (SOIC, 8-Leads, Body 4.9x3.9mm, Pitch 1.27mm, IPC Medium Density)
part A pins: 4 ANODE, 8 CATHODE
part B pins: 1 NC "No internal connection", 2 NC "No internal connection", 3 NC "No internal connection", 5 NC "No internal connection", 6 NC "No internal connection", 7 NC "No internal connection"

## LM385DE4-1-2
designator U?
Micropower Voltage Reference, 1.235 V, 20 ppm / degC, 20 mA, 0 to 70 degC, 8-pin SOIC (D), Green (RoHS & no Sb/Br); Manufacturer: Texas Instruments; PartNumber: LM385DE4-1-2; Initial Accuracy @ 25/deg C(%): 2; Iout/Iz(Max)(mA): 20; Min Iz for Regulation(uA): 10; Rating: Catalog; SubFamily: Shunt Voltage Reference; VO(V): 1.235; DatasheetVersion: SLVS075I; PackageVersion: 4040047-3/M; PackageReference: D8; PackageDescription: 8-Pin Plastic Small Outline, Body 4.9 x 3.9 mm, Pitch 1.27 mm; Supplier 1: Digi-Key; Supplier Part Number 1: LM385DE4-1-2-ND; Supplier 2: Mouser; Supplier Part Number 2: 595-LM385DE4-1-2; Eco-Plan: Green (RoHS & no Sb/Br); Temp Coeff(Typ)(ppm/ degree C): 20; Mounting Technology: Surface Mount; Code_JEDEC: MS-012; ComponentLink1Description: Manufacturer URL; ComponentLink1URL: http://www.ti.com/; ComponentLink2Description: Datasheet; ComponentLink2URL: http://www.ti.com/general/docs/lit/getliterature.tsp?genericPartNumber=LM385-1.2&fileType=pdf; ComponentLink3Description: Package Specification; ComponentLink3URL: http://www.ti.com/litv/pdf/msoi002j; ComponentLink4Description: URL Link1; ComponentLink4URL: Samples URL:http://www.ti.com/lit/ds/symlink/lm385-1.2.pdf
footprint TI-D8_N (SOIC, 8-Leads, Body 4.9x3.9mm, Pitch 1.27mm, IPC Medium Density)
part A pins: 4 ANODE, 8 CATHODE
part B pins: 1 NC "No internal connection", 2 NC "No internal connection", 3 NC "No internal connection", 5 NC "No internal connection", 6 NC "No internal connection", 7 NC "No internal connection"

## LM385DE4-2-5
designator U?
Micropower Voltage Reference, 2.5 V, 20 ppm / degC, 20 mA, 0 to 70 degC, 8-pin SOIC (D), Green (RoHS & no Sb/Br); Manufacturer: Texas Instruments; PartNumber: LM385DE4-2-5; Initial Accuracy @ 25/deg C(%): 3; Iout/Iz(Max)(mA): 20; Rating: Catalog; SubFamily: Shunt Voltage Reference; VO(V): 2.5; DatasheetVersion: SLVS023J; PackageVersion: 4040047-3/M; PackageReference: D8; PackageDescription: 8-Pin Plastic Small Outline, Body 4.9 x 3.9 mm, Pitch 1.27 mm; Supplier 1: Digi-Key; Supplier Part Number 1: LM385DE4-2-5-ND; Supplier 2: Mouser; Supplier Part Number 2: 595-LM385DE4-2-5; Eco-Plan: Green (RoHS & no Sb/Br); Min Iz for Regulation(uA): 20; Temp Coeff(Typ)(ppm/ degree C): 20; Mounting Technology: Surface Mount; Code_JEDEC: MS-012; ComponentLink1Description: Manufacturer URL; ComponentLink1URL: http://www.ti.com/; ComponentLink2Description: Datasheet; ComponentLink2URL: http://www.ti.com/general/docs/lit/getliterature.tsp?genericPartNumber=LM385-2.5&fileType=pdf; ComponentLink3Description: Package Specification; ComponentLink3URL: http://www.ti.com/litv/pdf/msoi002j
footprint TI-D8_N (SOIC, 8-Leads, Body 4.9x3.9mm, Pitch 1.27mm, IPC Medium Density)
part A pins: 4 ANODE, 8 CATHODE
part B pins: 1 NC "No internal connection", 2 NC "No internal connection", 3 NC "No internal connection", 5 NC "No internal connection", 6 NC "No internal connection", 7 NC "No internal connection"